# Altium footprint library DrPCB.PcbLib: 910 footprints (part 52 of 57)
Each footprint in its own frame and in the unit in brackets; x right, y up, seen from the top. Pads: shape width x height; smd on the part's side, far side on the other; paste and mask are expansions set on the pad; w line width, h text height; cw(c..) or ccw(c..) is an arc to the next point about the centre after c.
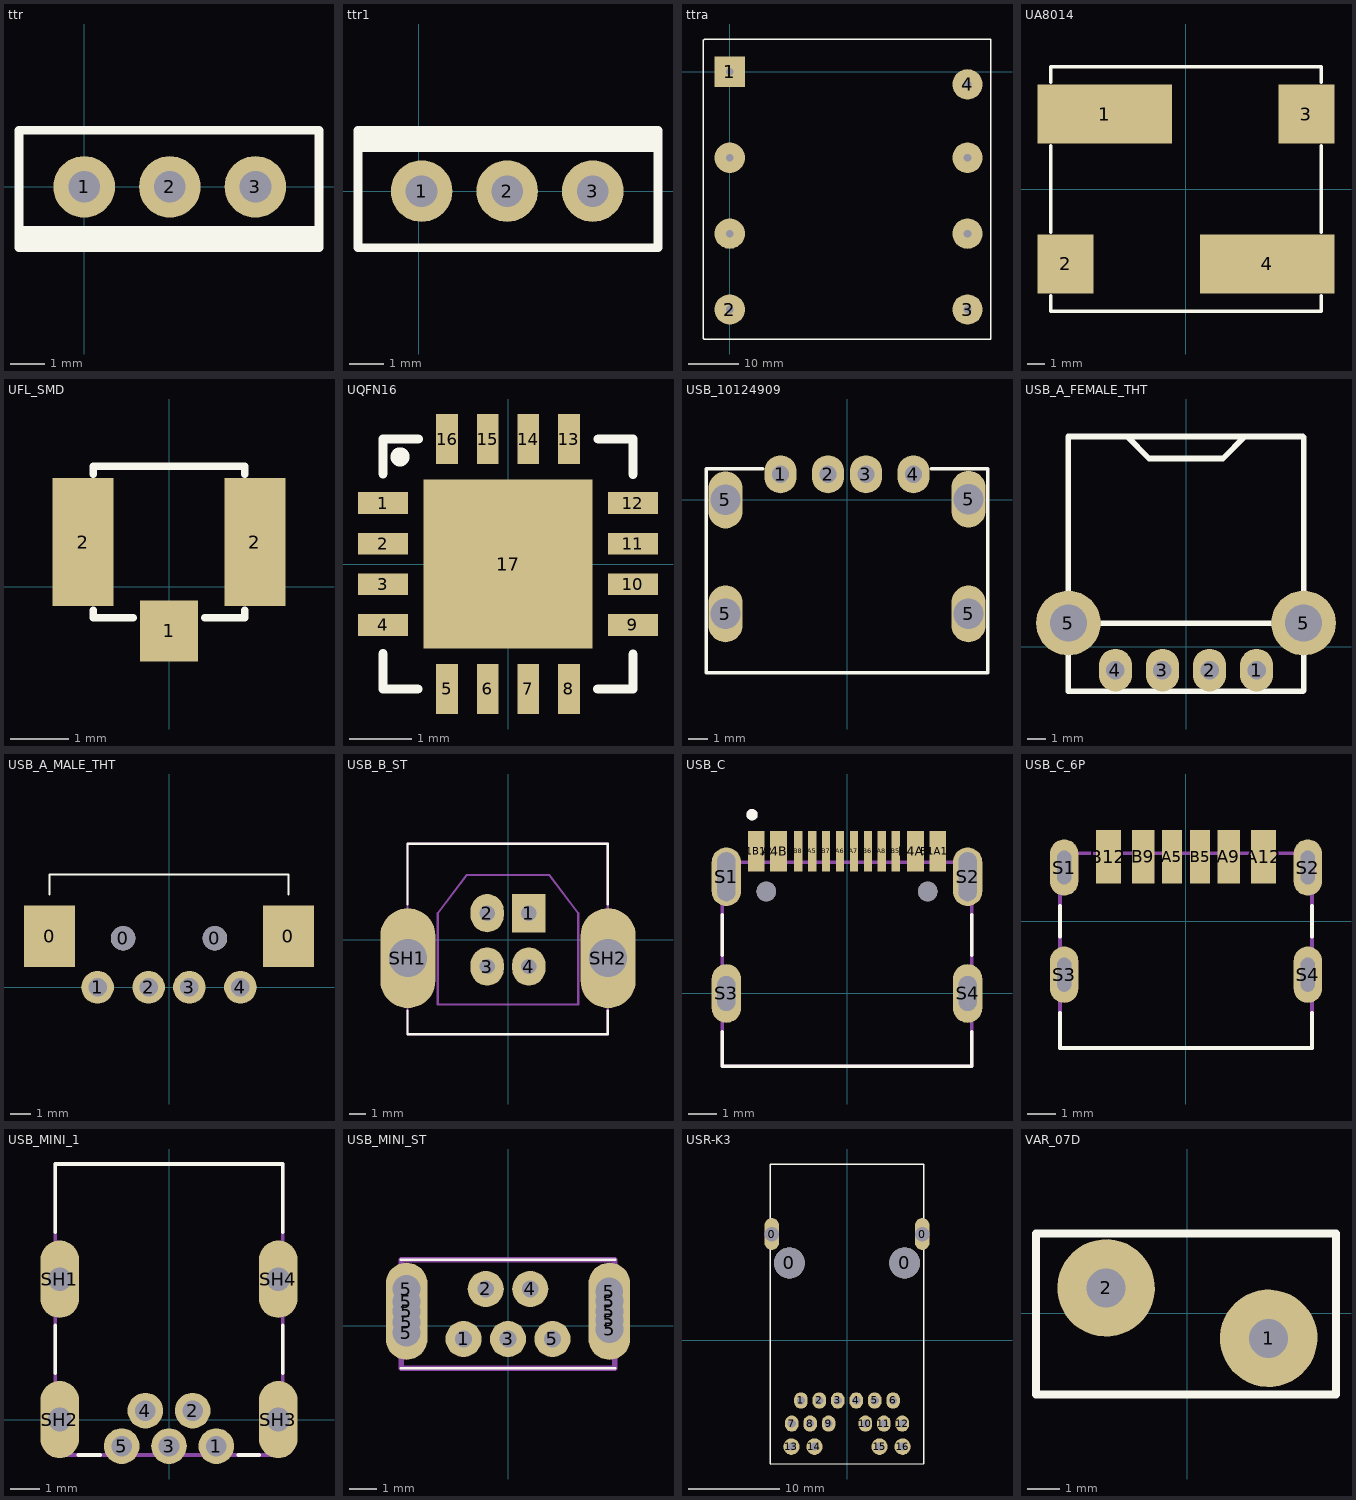
[diagram p51: the footprints below, top view; thin cyan lines are the x and y axes]

## ttr [mm]
pads (3):
  round 1.8 hole 0.93: 1(0,0) 2(2.5,0) 3(5,0)
Top Overlay:
  lines w0.254: -1.905,-1.524 6.858,-1.524 6.858,-1.27 -1.905,-1.27 ; -1.905,-1.778 6.858,-1.778 6.858,1.651 -1.905,1.651 -1.905,-1.778

## ttr1 [mm]
pads (3):
  round 1.8 hole 0.93: 1(0.08,0) 2(2.58,0) 3(5.08,0)
Top Overlay:
  lines w0.254: 6.985,1.27 -1.778,1.27 -1.778,1.524 6.985,1.524 ; -1.778,-1.651 -1.778,1.778 6.985,1.778 6.985,-1.651 -1.778,-1.651

## ttra [mm]
pads (8):
  rect 6x6 hole 1.5: 1(0,0)
  round 6 hole 1.5: 2(0,-47) 3(47,-47) 4(47,-2.5) ""(0,-32) ""(0,-17) ""(47,-32) ""(47,-17)
Top Overlay:
  lines w0.254: -5.207,-52.705 -5.207,6.223 -4.953,6.477 51.562,6.477 51.562,-52.832 -5.08,-52.832 -5.207,-52.705

## UA8014 [mm]
pads (4):
  rect 7.7x3.4 smd: 1(-4.65,4.3) 4(4.65,-4.3)
  rect 3.2x3.4 smd: 2(-6.9,-4.3) 3(6.9,4.3)
Top Overlay:
  lines w0.2: -7.75,-6.124 -7.75,-7 7.75,-7 7.75,-6.124 ; -7.75,-2.489 -7.75,2.489 ; -7.75,6.124 -7.75,7 7.75,7 7.75,6.124 ; 7.75,-2.489 7.75,2.489
3D body "Coilcraft-RA7231-AL.step": height 16.01, standoff 0.01, extent -7.75,-7 7.75,7

## UFL_SMD [mm]
pads (3):
  rect 1x1.05 smd: 1(0,-0.762)
  rect 1.05x2.2 smd: 2(-1.475,0.763) 2(1.475,0.763)
Top Overlay:
  lines w0.127: -1.3,-0.406 -1.3,-0.537 -0.61,-0.537 ; -1.3,1.931 -1.3,2.063 1.3,2.063 1.3,1.931 ; 0.61,-0.537 1.3,-0.537 1.3,-0.406
3D body "User Library-U_FL-R-SMT(10).step": height 1.25, standoff 0, extent -1.5,-0.788 1.5,2.312

## UQFN16 [mm]
pads (17):
  rect 0.8x0.35 smd paste-0.08: 1(-2,0.975) 2(-2,0.325) 3(-2,-0.325) 4(-2,-0.975) 9(2,-0.975) 10(2,-0.325) 11(2,0.325) 12(2,0.975)
  rect 0.35x0.8 smd paste-0.08: 5(-0.975,-2) 6(-0.325,-2) 7(0.325,-2) 8(0.975,-2) 13(0.975,2) 14(0.325,2) 15(-0.325,2) 16(-0.975,2)
  rect 2.7x2.7 smd paste-0.3: 17(0,0)
Top Overlay:
  circle w0.254: c-1.727,1.714 r0.025
  lines w0.15: -2,-1.435 -2,-2 -1.441,-2 ; -2,1.441 -2,2 -1.435,2 ; 1.435,-2 2,-2 2,-1.441 ; 1.441,2 2,2 2,1.435
3D body "ALSRobot-QFN16 4x4.step": height 0.92, standoff 0, extent -2,-2 2,2

## USB_10124909 [mm]
pads (8):
  oval 1.7x2 hole 0.9: 1(-3.5,1.35) 2(-1,1.35) 3(1,1.35) 4(3.5,1.35)
  oval 1.8x3 hole 1.6: 5(-6.4,-6) 5(-6.4,0) 5(6.4,-6) 5(6.4,0.038)
Top Overlay:
  lines w0.2: -7.417,-9.1 -7.417,1.638 -4.445,1.638 ; -7.391,-9.1 7.417,-9.1 7.417,1.638 4.445,1.638
3D body "614104150121.stp": height 7.23, standoff -1.59, extent -7.287,-8.545 7.313,1.455

## USB_A_FEMALE_THT [mm]
pads (6):
  oval 1.8x2.3 hole 1: 1(3.81,-1.27) 2(1.27,-1.27) 3(-1.27,-1.27) 4(-3.81,-1.27)
  round 3.5 hole 2: 5(-6.35,1.27) 5(6.35,1.27)
Top Overlay:
  lines w0.305: -6.35,11.303 -6.35,-2.413 6.31,-2.413 6.35,-2.373 6.35,11.303 6.31,11.343 3.175,11.343 ; -6.35,11.343 -3.175,11.343 ; -5.588,1.27 5.588,1.27 ; -3.175,11.343 3.175,11.343 ; -3.175,11.343 -1.992,10.16 1.992,10.16 3.175,11.343
3D body "User Library-USB-A-01.step": height 6.96, standoff -4.19, extent -7.9,-2.248 7.9,11.452

## USB_A_MALE_THT [mm]
pads (8):
  rect 2.5x3 smd: 0(-5.85,2.5) 0(5.85,2.5)
  round 1.2 hole 1.2: 0(-2.25,2.4) 0(2.25,2.4)
  round 1.6 hole 0.9: 1(-3.5,0) 2(-1,0) 3(1,0) 4(3.5,0)
Top Overlay:
  lines w0.1: -5.85,4.547 -5.85,5.537 5.85,5.537 5.85,4.547
3D body "14380.stp": height 3.11, standoff -2.69, extent -6.239,0.076 6.366,20.001

## USB_B_ST [mm]
pads (6):
  rect 2x2.3 hole 0.92: 1(1.25,1.605)
  oval 2x2.3 hole 0.92: 2(-1.25,1.605) 3(-1.25,-1.605) 4(1.25,-1.605)
  oval 3.316x6 hole 2.3: SH1(-6.02,-1.1) SH2(6.02,-1.1)
Top Overlay:
  lines w0.127: -6.035,-4.255 -6.035,-5.68 5.995,-5.68 5.995,-4.255 ; -6.035,2.134 -6.035,5.78 5.995,5.78 5.995,2.134
Mechanical 13:
  circle w0.3: c1.25,1.605 r0.15
  lines w0.127: -6.035,-5.68 5.995,-5.68 5.995,5.78 -6.035,5.78 -6.035,-5.68 ; -4.225,-3.89 4.225,-3.89 4.225,1.605 2.5,3.89 -2.5,3.89 -4.225,1.605 -4.225,-3.89
3D body "User Library-mouser_806-kusbvx-bs1n-b.step": height 16.01, standoff -3.79, extent -7.146,-5.65 7.146,5.65

## USB_C [mm]
pads (18):
  rect 0.6x1.45 smd: A1B12(-3.25,5.095) A4B9(-2.45,5.095) B1A12(3.25,5.095) B4A9(2.45,5.095)
  rect 0.3x1.45 smd: A5(-1.25,5.095) A6(-0.25,5.095) A7(0.25,5.095) A8(1.25,5.095) B5(1.75,5.095) B6(0.75,5.095) B7(-0.75,5.095) B8(-1.75,5.095)
  oval 1.05x2.1 hole 0.65 slot 1.75 at 90 deg: S1(-4.32,4.18) S2(4.32,4.18)
  oval 1.05x2.1 hole 0.65 slot 1.25 at 90 deg: S3(-4.32,0) S4(4.32,0)
  round 0.7 hole 0.7 unplated: ""(-2.89,3.65) ""(2.89,3.65)
Top Overlay:
  circle w0.2: c-3.4,6.4 r0.1
  lines w0.127: -4.47,-1.37 -4.47,-2.6 4.47,-2.6 4.47,-1.37 ; -4.47,1.37 -4.47,2.81 ; 4.47,1.37 4.47,2.81
Mechanical 13:
  circle w0.2: c-3.4,6.4 r0.1
  lines w0.127: -4.47,-2.6 -4.47,4.7 4.47,4.7 4.47,-2.6 -4.47,-2.6
3D body "TYPE-C-31-M-12--3DModel-STEP-56544.STEP": height 3.31, standoff -0.99, extent -4.47,-2.6 4.47,5.305

## USB_C_6P [mm]
pads (10):
  rect 0.7x1.9 smd: A5(-0.5,2.278) B5(0.5,2.278)
  rect 0.8x1.9 smd: A9(1.52,2.278) B9(-1.52,2.278)
  rect 0.9x1.9 smd: A12(2.75,2.278) B12(-2.75,2.278)
  oval 1x2 hole 0.5 slot 1.2 at 90 deg: S1(-4.32,1.898) S2(4.32,1.898) S3(-4.32,-1.902) S4(4.32,-1.902)
Top Overlay:
  lines w0.127: -4.47,-3.252 -4.47,-4.502 4.47,-4.502 4.47,-3.252 ; -4.47,-0.552 -4.47,0.548 ; 4.47,-0.552 4.47,0.548
Mechanical 13:
  lines w0.127: -4.47,-4.502 -4.47,2.398 4.47,2.398 4.47,-4.502 -4.47,-4.502
3D body "UJC-HP-3-SMT-TR--3DModel-STEP-56544.STEP": height 3.26, standoff -1, extent -4.47,-4.503 4.47,2.398

## USB_MINI_1 [mm]
pads (9):
  round 1.208 hole 0.7: 1(1.6,-0.9) 2(0.8,0.3) 3(0,-0.9) 4(-0.8,0.3) 5(-1.6,-0.9)
  oval 1.308x2.616 hole 0.8 square: SH1(-3.7,4.75) SH2(-3.7,0) SH3(3.7,0) SH4(3.7,4.75)
Top Overlay:
  lines w0.127: -3.85,1.57 -3.85,3.18 ; -3.85,6.34 -3.85,8.65 3.85,8.65 3.85,6.34 ; -3.06,-1.2 -2.33,-1.2 ; 2.34,-1.2 3.05,-1.2 ; 3.85,1.57 3.85,3.18
Mechanical 13:
  lines w0.127: -3.85,-1.2 3.85,-1.2 3.85,8.65 -3.85,8.65 -3.85,-1.2
3D body "XM7D-0512--3DModel-STEP-1.STEP": height 4, standoff -1.9, extent -4.05,-1.275 4.05,8.575

## USB_MINI_ST [mm]
pads (15):
  round 1.3 hole 0.6: 1(-1.6,-0.475) 2(-0.8,1.325) 3(0,-0.475) 4(0.8,1.325) 5(1.6,-0.475)
  round 1 hole 1: 5(-3.658,-0.241) 5(-3.658,0.864) 5(-3.658,1.321) 5(-3.65,0.127) 5(3.645,1.232) 5(3.65,0.203) 5(3.65,0.889) 5(3.658,-0.127)
  oval 1.5x3.5 hole 1: 5(-3.65,0.525) 5(3.65,0.525)
Top Overlay:
  lines w0.1: -3.85,-1.525 3.85,-1.525 ; -3.85,2.375 3.85,2.375
Mechanical 13:
  lines w0.2: -3.85,-1.525 -3.85,2.375 3.85,2.375 3.85,-1.525 -3.85,-1.525
3D body "10119313-301TLF--3DModel-STEP-533217.STEP": height 9.46, standoff -2.01, extent -3.85,-1.534 3.85,2.384

## USR-K3 [mm]
pads (20):
  oval 1.6x3.5 hole 1.6: 0(-8.285,11.7) 0(8.285,11.7)
  round 3.4 hole 3.4: 0(-6.35,8.52) 0(6.35,8.52)
  oval 1.5x1.8 hole 0.9: 1(-5.075,-6.62) 2(-3.045,-6.62) 3(-1.015,-6.62) 4(1.015,-6.62) 5(3.045,-6.62) 6(5.075,-6.62) 7(-6.085,-9.16) 8(-4.055,-9.16) 9(-2.025,-9.16) 10(2.025,-9.16) 11(4.055,-9.16) 12(6.085,-9.16)
  round 1.8 hole 0.9: 13(-6.12,-11.7) 14(-3.58,-11.7) 15(3.58,-11.7) 16(6.12,-11.7)
Top Overlay:
  lines w0.15: -8.439,10.839 -8.439,-13.61 8.44,-13.61 8.44,10.839 ; -8.439,12.567 -8.439,19.412 8.44,19.412 8.44,12.567
3D body "User Library-WE-RJ45 LAN HPLE RJ45 LAN Transformer_799111614_WürthElektronik.step": height 14.91, standoff -3.99, extent -9.939,-13.627 9.931,19.393

## VAR_07D [mm]
pads (2):
  round 3 hole 1.2: 1(2.502,-0.775) 2(-2.502,0.775)
Top Overlay:
  lines w0.254: -4.661,-2.504 4.572,-2.504 4.572,2.449 -4.661,2.449 -4.661,-2.504
3D body "MOV-07D470K.STEP": height 11, standoff -18, extent -4.547,-2.528 4.453,2.472